# Altium schematic symbol library SignalCommunications.SCHLIB: 804 symbols (part 3 of 9) (continued)
## WE-RJ45-LAN-10/100/1000BT-SMD-7498111001 (continued)
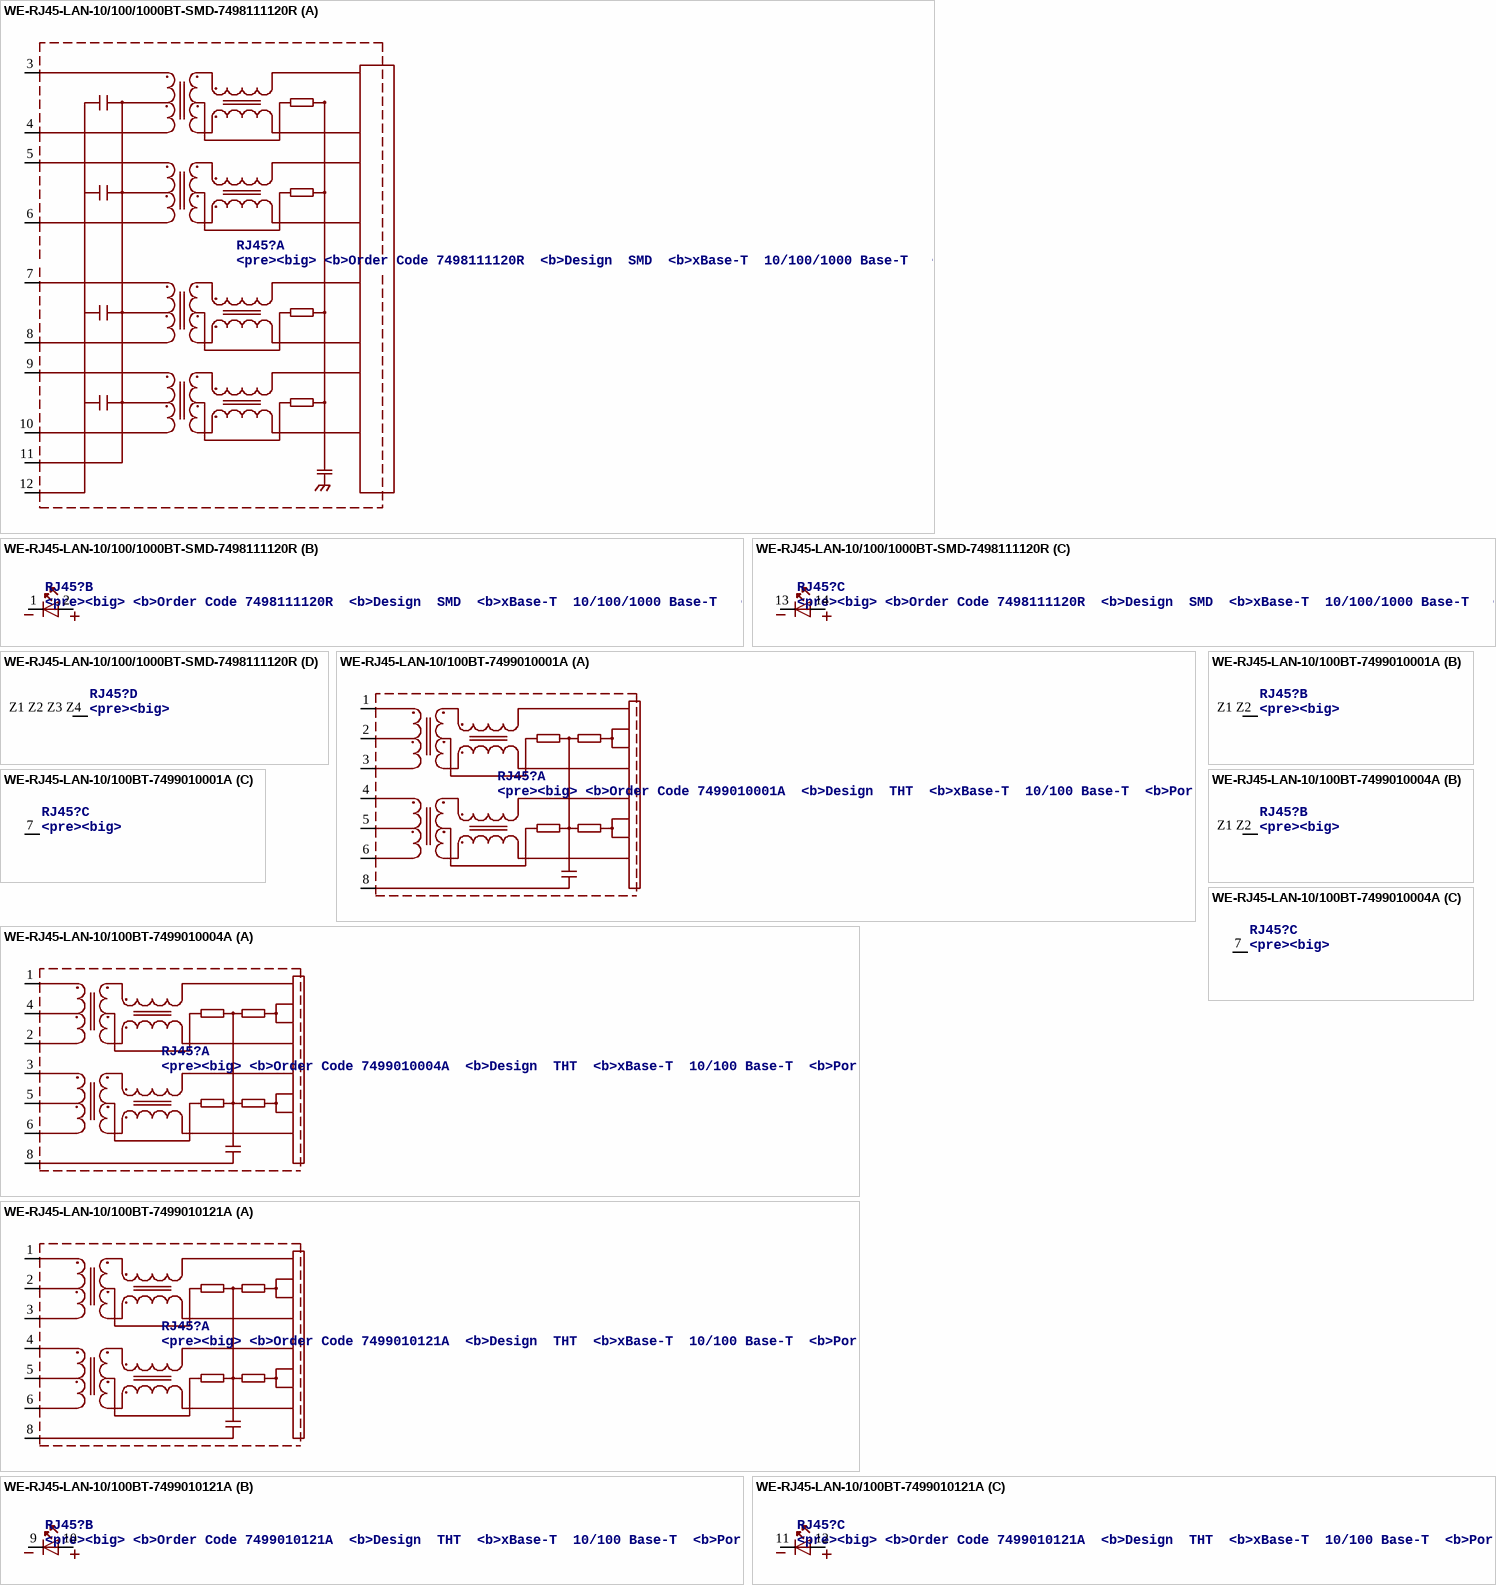
[diagram p19: symbols WE-RJ45-LAN-10/100/1000BT-SMD-7498111120R to WE-RJ45-LAN-10/100BT-7499010121A]

## WE-RJ45-LAN-10/100/1000BT-SMD-7498111120R
designator RJ45?, comment <pre><big> / <b>Order Code	7498111120R / <b>Design		SMD / <b>xBase-T		10/100/1000 Base-T / <b>Ports		1x1 / <b>Application	Standard / <b>Tab Position	UP / <b>LED (Left-Right)	YELLOW-GREEN / <b>EMI Fingers	Yes
MANUFACTURER: Würth Elektronik eiSos GmbH; CREATED-BY: Christin Zierenner; COMPANY-URL: http://www.we-online.de; CREATED-DATE: AUG 2012; DATASHEET-URL: http://katalog.we-online.de/kataloge/eisos/media/pdf/7498111120R.pdf
footprint 7498111120R
part A pins: 3 TRD0+, 4 TRD0-, 5 TRD1+, 6 TRD1-, 7 TRD2+, 8 TRD2-, 9 TRD3+, 10 TRD3-, 11 VCC (power), 12 GND (power)
part B pins: 1 K, 2 A
part C pins: 13 K, 14 A
part D pins: Z1 Z2 Z3 Z4 P$1 (power)

## WE-RJ45-LAN-10/100BT-7499010001A
designator RJ45?, comment <pre><big> / <b>Order Code	7499010001A / <b>Design		THT / <b>xBase-T		10/100 Base-T / <b>Ports		1x1 / <b>Application	Standard / <b>Tab Position	UP / <b>LED (Left-Right)	NONE / <b>EMI Fingers	No
MANUFACTURER: Würth Elektronik eiSos GmbH; CREATED-BY: Christin Zierenner; COMPANY-URL: http://www.we-online.de; CREATED-DATE: AUG 2012; DATASHEET-URL: http://katalog.we-online.de/kataloge/eisos/media/pdf/7499010001A.pdf
footprint 74990-WITHOUT-LED
part A pins: 1 RD+, 2 RCT, 3 RD-, 4 TD+, 5 TCT, 6 TD-, 8 SH (power)
part B pins: Z1 Z2 P$1 (power)
part C pins: 7 NC

## WE-RJ45-LAN-10/100BT-7499010004A
designator RJ45?, comment <pre><big> / <b>Order Code	7499010004A / <b>Design		THT / <b>xBase-T		10/100 Base-T / <b>Ports		1x1 / <b>Application	Standard / <b>Tab Position	Down / <b>LED (Left-Right)	NONE / <b>EMI Fingers	No
MANUFACTURER: Würth Elektronik eiSos GmbH; CREATED-BY: Christin Zierenner; COMPANY-URL: http://www.we-online.de; CREATED-DATE: AUG 2012; DATASHEET-URL: http://katalog.we-online.de/kataloge/eisos/media/pdf/7499010004A.pdf
footprint 7499010004A
part A pins: 1 RD+, 2 RD-, 3 TD+, 4 RCT, 5 TCT, 6 TD-, 8 SH (power)
part B pins: Z1 Z2 P$1 (power)
part C pins: 7 NC

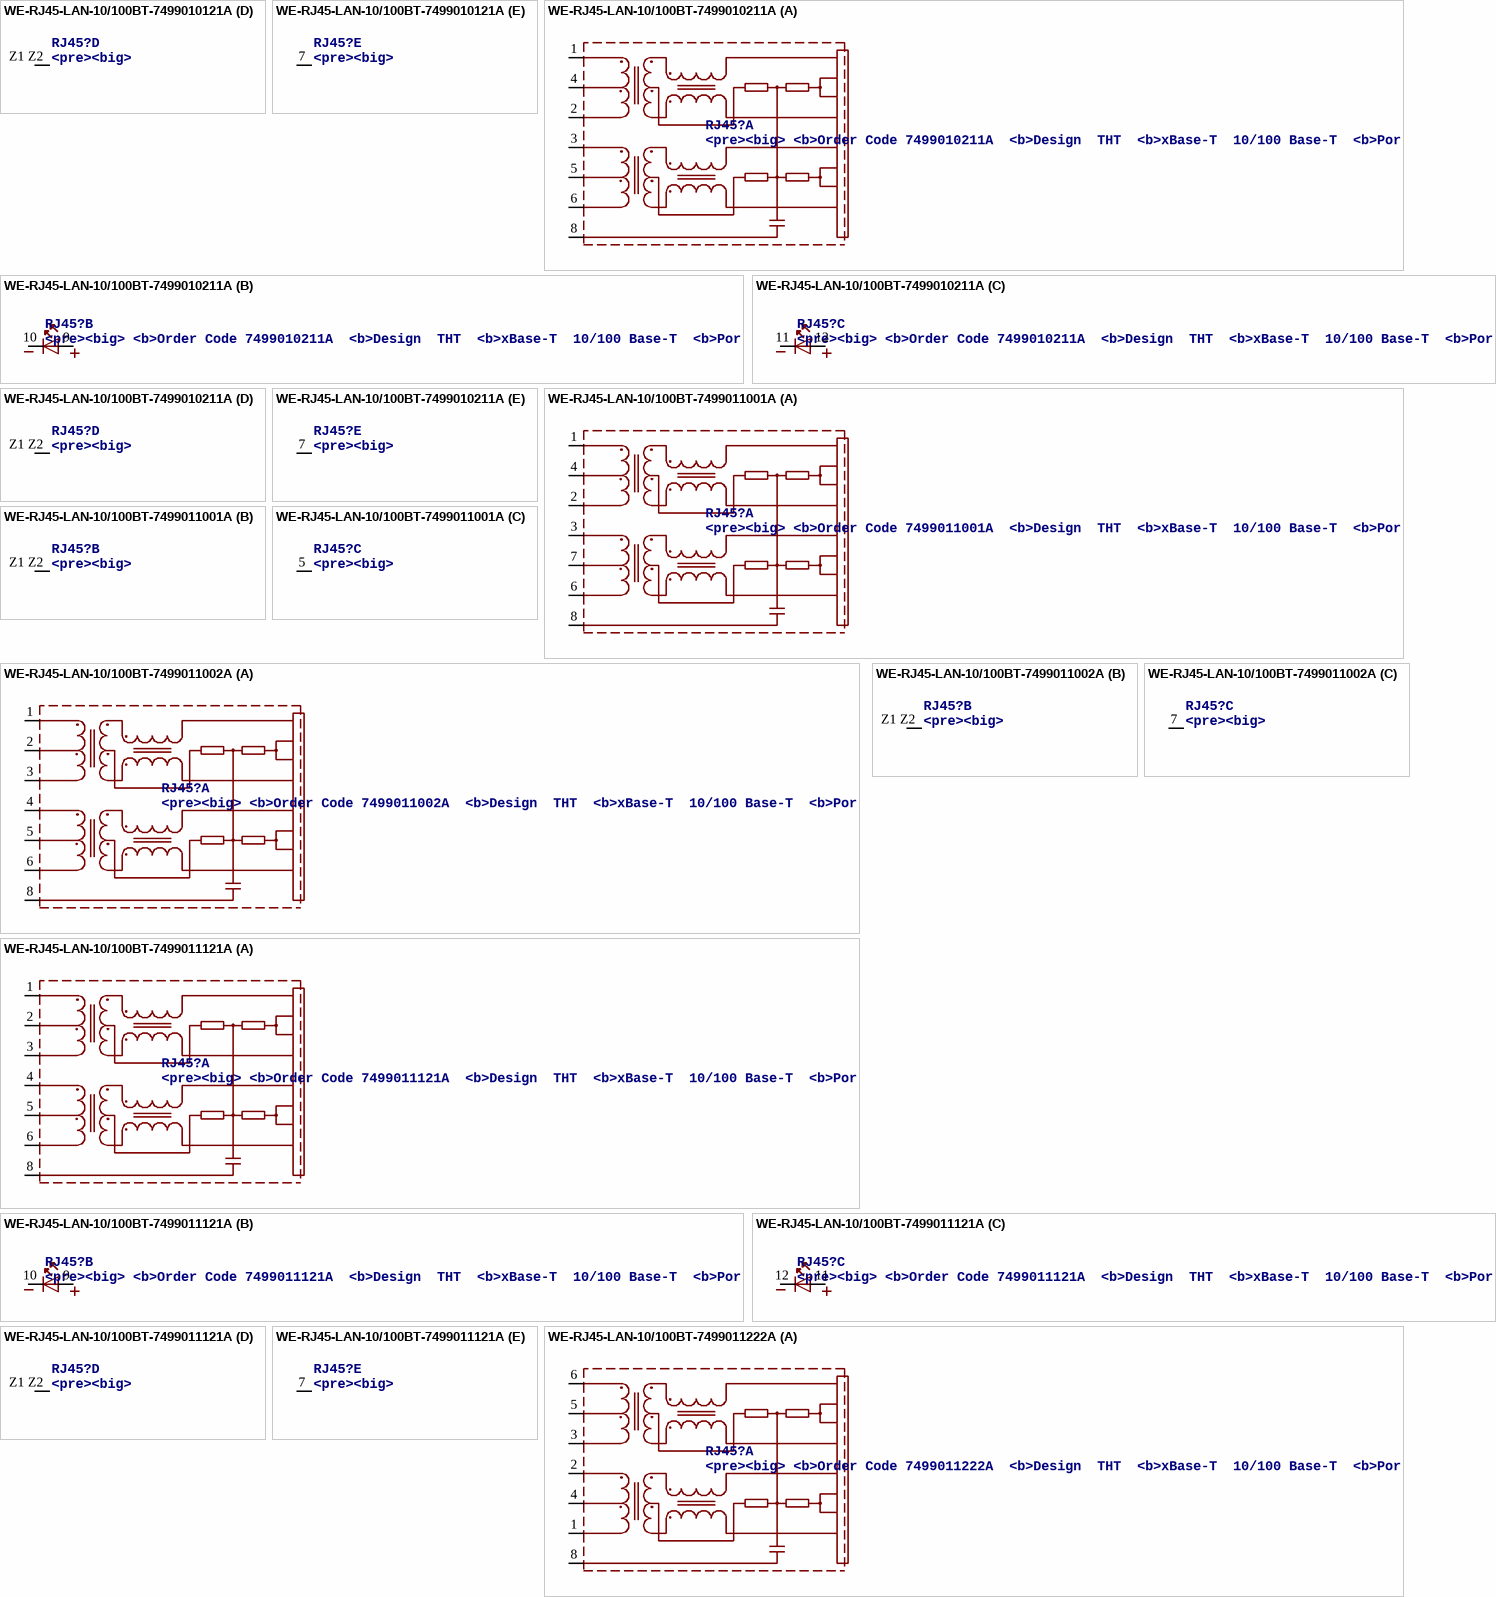
[diagram p20: symbols WE-RJ45-LAN-10/100BT-7499010121A to WE-RJ45-LAN-10/100BT-7499011222A]

## WE-RJ45-LAN-10/100BT-7499010121A
designator RJ45?, comment <pre><big> / <b>Order Code	7499010121A / <b>Design		THT / <b>xBase-T		10/100 Base-T / <b>Ports		1x1 / <b>Application	Standard / <b>Tab Position	UP / <b>LED (Left-Right)	Yellow-Green / <b>EMI Fingers	No
MANUFACTURER: Würth Elektronik eiSos GmbH; CREATED-BY: Christin Zierenner; COMPANY-URL: http://www.we-online.de; CREATED-DATE: AUG 2012; DATASHEET-URL: http://katalog.we-online.de/kataloge/eisos/media/pdf/7499010121A.pdf
footprint 74990-WITH-LED
part A pins: 1 TD+, 2 TCT, 3 TD-, 4 RD+, 5 RCT, 6 RD-, 8 SH (power)
part B pins: 9 K, 10 A
part C pins: 11 K, 12 A
part D pins: Z1 Z2 P$1 (power)
part E pins: 7 NC

## WE-RJ45-LAN-10/100BT-7499010211A
designator RJ45?, comment <pre><big> / <b>Order Code	7499010211A / <b>Design		THT / <b>xBase-T		10/100 Base-T / <b>Ports		1x1 / <b>Application	Standard / <b>Tab Position	DOWN / <b>LED (Left-Right)	Green-Yellow / <b>EMI Fingers	No
MANUFACTURER: Würth Elektronik eiSos GmbH; CREATED-BY: Christin Zierenner; COMPANY-URL: http://www.we-online.de; CREATED-DATE: AUG 2012; DATASHEET-URL: http://katalog.we-online.de/kataloge/eisos/media/pdf/7499010211A.pdf
footprint 74990-WITH-LED-TYPE2
part A pins: 1 TD+, 2 TD-, 3 RD+, 4 TCT, 5 RCT, 6 RD-, 8 SH (power)
part B pins: 9 A, 10 K
part C pins: 11 K, 12 A
part D pins: Z1 Z2 P$1 (power)
part E pins: 7 NC

## WE-RJ45-LAN-10/100BT-7499011001A
designator RJ45?, comment <pre><big> / <b>Order Code	7499011001A / <b>Design		THT / <b>xBase-T		10/100 Base-T / <b>Ports		1x1 / <b>Application	Standard / <b>Tab Position	Down / <b>LED (Left-Right)	NONE / <b>EMI Fingers	Yes
MANUFACTURER: Würth Elektronik eiSos GmbH; CREATED-BY: Christin Zierenner; COMPANY-URL: http://www.we-online.de; CREATED-DATE: AUG 2012; DATASHEET-URL: http://katalog.we-online.de/kataloge/eisos/media/pdf/7499011001A.pdf
footprint 74990-WITHOUT-LED-(21.84X15.88MM)
part A pins: 1 TD+, 2 TD-, 3 RD+, 4 TCT, 6 RD-, 7 RCT, 8 SH (power)
part B pins: Z1 Z2 P$1 (power)
part C pins: 5 NC

## WE-RJ45-LAN-10/100BT-7499011002A
designator RJ45?, comment <pre><big> / <b>Order Code	7499011002A / <b>Design		THT / <b>xBase-T		10/100 Base-T / <b>Ports		1x1 / <b>Application	Standard / <b>Tab Position	Down / <b>LED (Left-Right)	NONE / <b>EMI Fingers	Yes
MANUFACTURER: Würth Elektronik eiSos GmbH; CREATED-BY: Christin Zierenner; COMPANY-URL: http://www.we-online.de; CREATED-DATE: AUG 2012; DATASHEET-URL: http://katalog.we-online.de/kataloge/eisos/media/pdf/7499011002A.pdf
footprint 74990-WITHOUT-LED-(21.84X15.88MM)
part A pins: 1 TD+, 2 TCT, 3 TD-, 4 RD+, 5 RCT, 6 RD-, 8 SH (power)
part B pins: Z1 Z2 P$1 (power)
part C pins: 7 NC

## WE-RJ45-LAN-10/100BT-7499011121A
designator RJ45?, comment <pre><big> / <b>Order Code	7499011121A / <b>Design		THT / <b>xBase-T		10/100 Base-T / <b>Ports		1x1 / <b>Application	Standard / <b>Tab Position	DOWN / <b>LED (Left-Right)	Yellow-Green / <b>EMI Fingers	Yes
MANUFACTURER: Würth Elektronik eiSos GmbH; CREATED-BY: Christin Zierenner; COMPANY-URL: http://www.we-online.de; CREATED-DATE: AUG 2012; DATASHEET-URL: http://katalog.we-online.de/kataloge/eisos/media/pdf/7499011121A.pdf
footprint 74990-WITH-LED-TYPE1
part A pins: 1 TD+, 2 TCT, 3 TD-, 4 RD+, 5 RCT, 6 RD-, 8 SH (power)
part B pins: 9 A, 10 K
part C pins: 11 A, 12 K
part D pins: Z1 Z2 P$1 (power)
part E pins: 7 NC

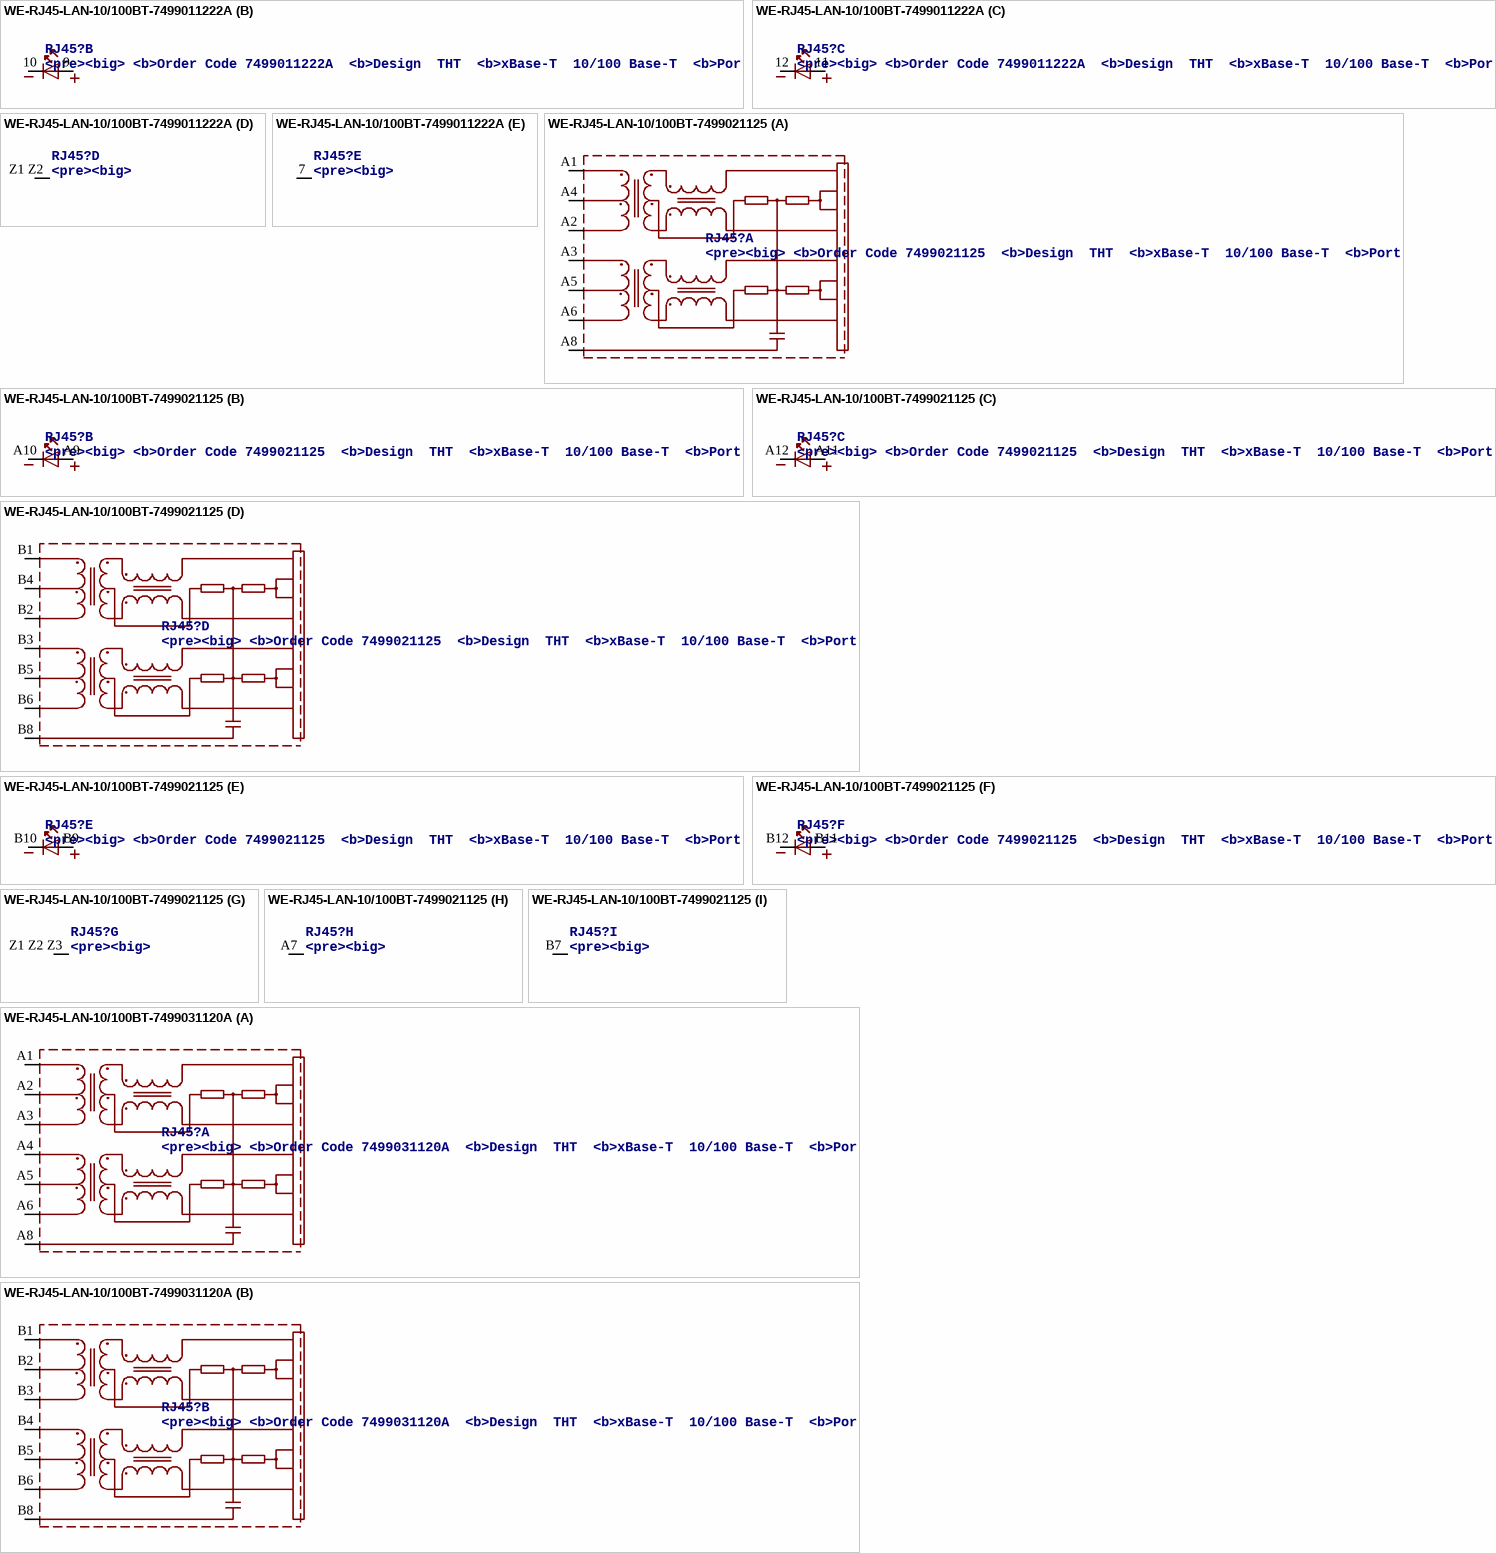
[diagram p21: symbols WE-RJ45-LAN-10/100BT-7499011222A to WE-RJ45-LAN-10/100BT-7499031120A]

## WE-RJ45-LAN-10/100BT-7499011222A
designator RJ45?, comment <pre><big> / <b>Order Code	7499011222A / <b>Design		THT / <b>xBase-T		10/100 Base-T / <b>Ports		1x1 / <b>Application	Standard / <b>Tab Position	DOWN / <b>LED (Left-Right)	Green-Green / <b>EMI Fingers	Yes
MANUFACTURER: Würth Elektronik eiSos GmbH; CREATED-BY: Christin Zierenner; COMPANY-URL: http://www.we-online.de; CREATED-DATE: AUG 2012; DATASHEET-URL: http://katalog.we-online.de/kataloge/eisos/media/pdf/7499011222A.pdf
footprint 74990-WITH-LED-TYPE1
part A pins: 1 TD-, 2 TD+, 3 RD-, 4 TCT, 5 RCT, 6 RD+, 8 SH (power)
part B pins: 9 A, 10 K
part C pins: 11 A, 12 K
part D pins: Z1 Z2 P$1 (power)
part E pins: 7 NC

## WE-RJ45-LAN-10/100BT-7499021125
designator RJ45?, comment <pre><big> / <b>Order Code	7499021125 / <b>Design		THT / <b>xBase-T		10/100 Base-T / <b>Ports		1x2 HORIZONTAL / <b>Application	Standard / <b>Tab Position	DOWN / <b>LED (Left-Right)	YELLOW-GREEN / <b>EMI Fingers	Yes
MANUFACTURER: Würth Elektronik eiSos GmbH; CREATED-BY: Christin Zierenner; COMPANY-URL: http://www.we-online.de; CREATED-DATE: AUG 2012; DATASHEET-URL: http://katalog.we-online.de/kataloge/eisos/media/pdf/7499021125.pdf
footprint 7499021125-2PORTS-HORIZONTAL
part A pins: A1 RD+, A2 RD-, A3 TD+, A4 RCT, A5 TCT, A6 TD-, A8 SH (power)
part B pins: A9 A, A10 K
part C pins: A11 A, A12 K
part D pins: B1 RD+, B2 RD-, B3 TD+, B4 RCT, B5 TCT, B6 TD-, B8 SH (power)
part E pins: B9 A, B10 K
part F pins: B11 A, B12 K
part G pins: Z1 Z2 Z3 P$1 (power)
part H pins: A7 NC
part I pins: B7 NC

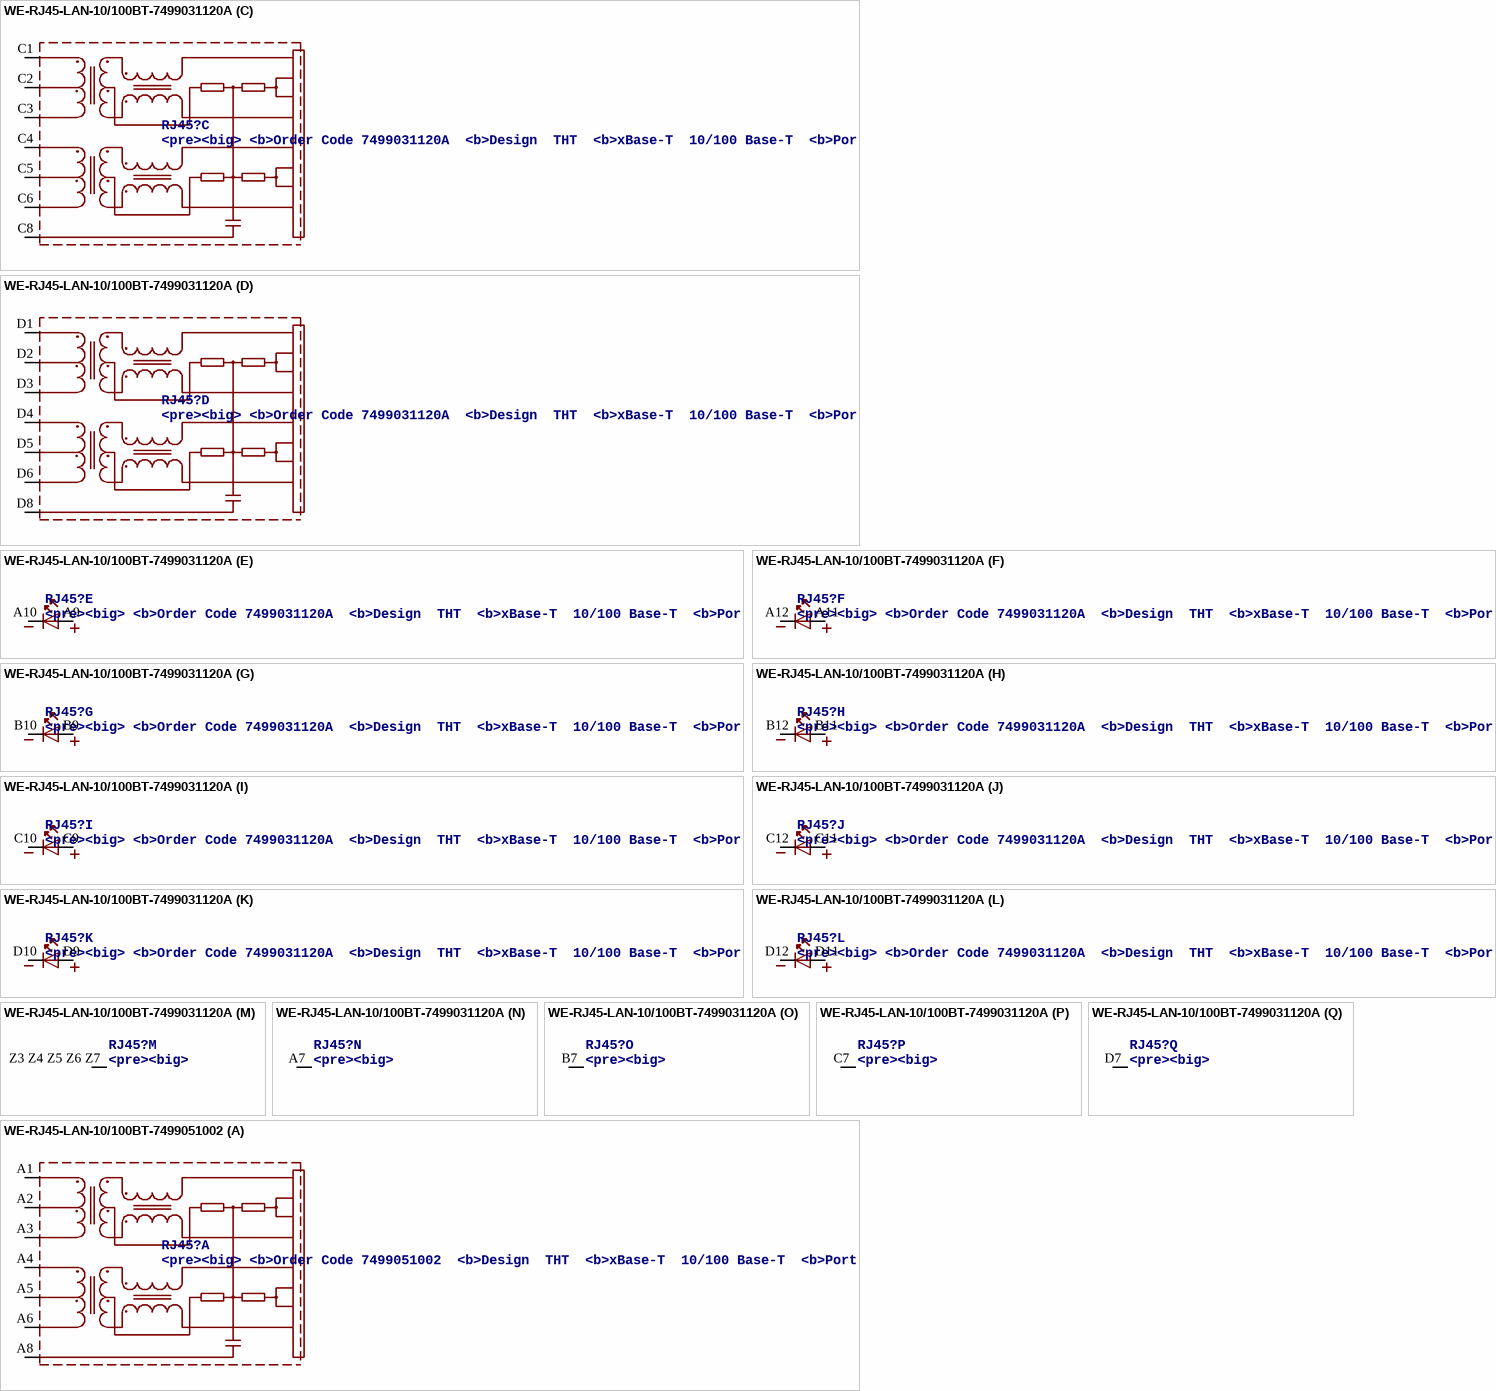
[diagram p22: symbols WE-RJ45-LAN-10/100BT-7499031120A to WE-RJ45-LAN-10/100BT-7499051002]

## WE-RJ45-LAN-10/100BT-7499031120A
designator RJ45?, comment <pre><big> / <b>Order Code	7499031120A / <b>Design		THT / <b>xBase-T		10/100 Base-T / <b>Ports		1x4 HORIZONTAL / <b>Application	Standard / <b>Tab Position	DOWN / <b>LED (Left-Right)	YELLOW-GREEN / <b>EMI Fingers	Yes
MANUFACTURER: Würth Elektronik eiSos GmbH; CREATED-BY: Christin Zierenner; COMPANY-URL: http://www.we-online.de; CREATED-DATE: AUG 2012; DATASHEET-URL: http://katalog.we-online.de/kataloge/eisos/media/pdf/7499031120A.pdf
footprint 7499031120A-4PORTS-HORIZONTAL
part A pins: A1 RD+, A2 RCT, A3 RD-, A4 TD+, A5 TCT, A6 TD-, A8 SH (power)
part B pins: B1 RD+, B2 RCT, B3 RD-, B4 TD+, B5 TCT, B6 TD-, B8 SH (power)
part C pins: C1 RD+, C2 RCT, C3 RD-, C4 TD+, C5 TCT, C6 TD-, C8 SH (power)
part D pins: D1 RD+, D2 RCT, D3 RD-, D4 TD+, D5 TCT, D6 TD-, D8 SH (power)
part E pins: A9 A, A10 K
part F pins: A11 A, A12 K
part G pins: B9 A, B10 K
part H pins: B11 A, B12 K
part I pins: C9 A, C10 K
part J pins: C11 A, C12 K
part K pins: D9 A, D10 K
part L pins: D11 A, D12 K
part M pins: Z3 Z4 Z5 Z6 Z7 P$1 (power)
part N pins: A7 NC
part O pins: B7 NC
part P pins: C7 NC
part Q pins: D7 NC

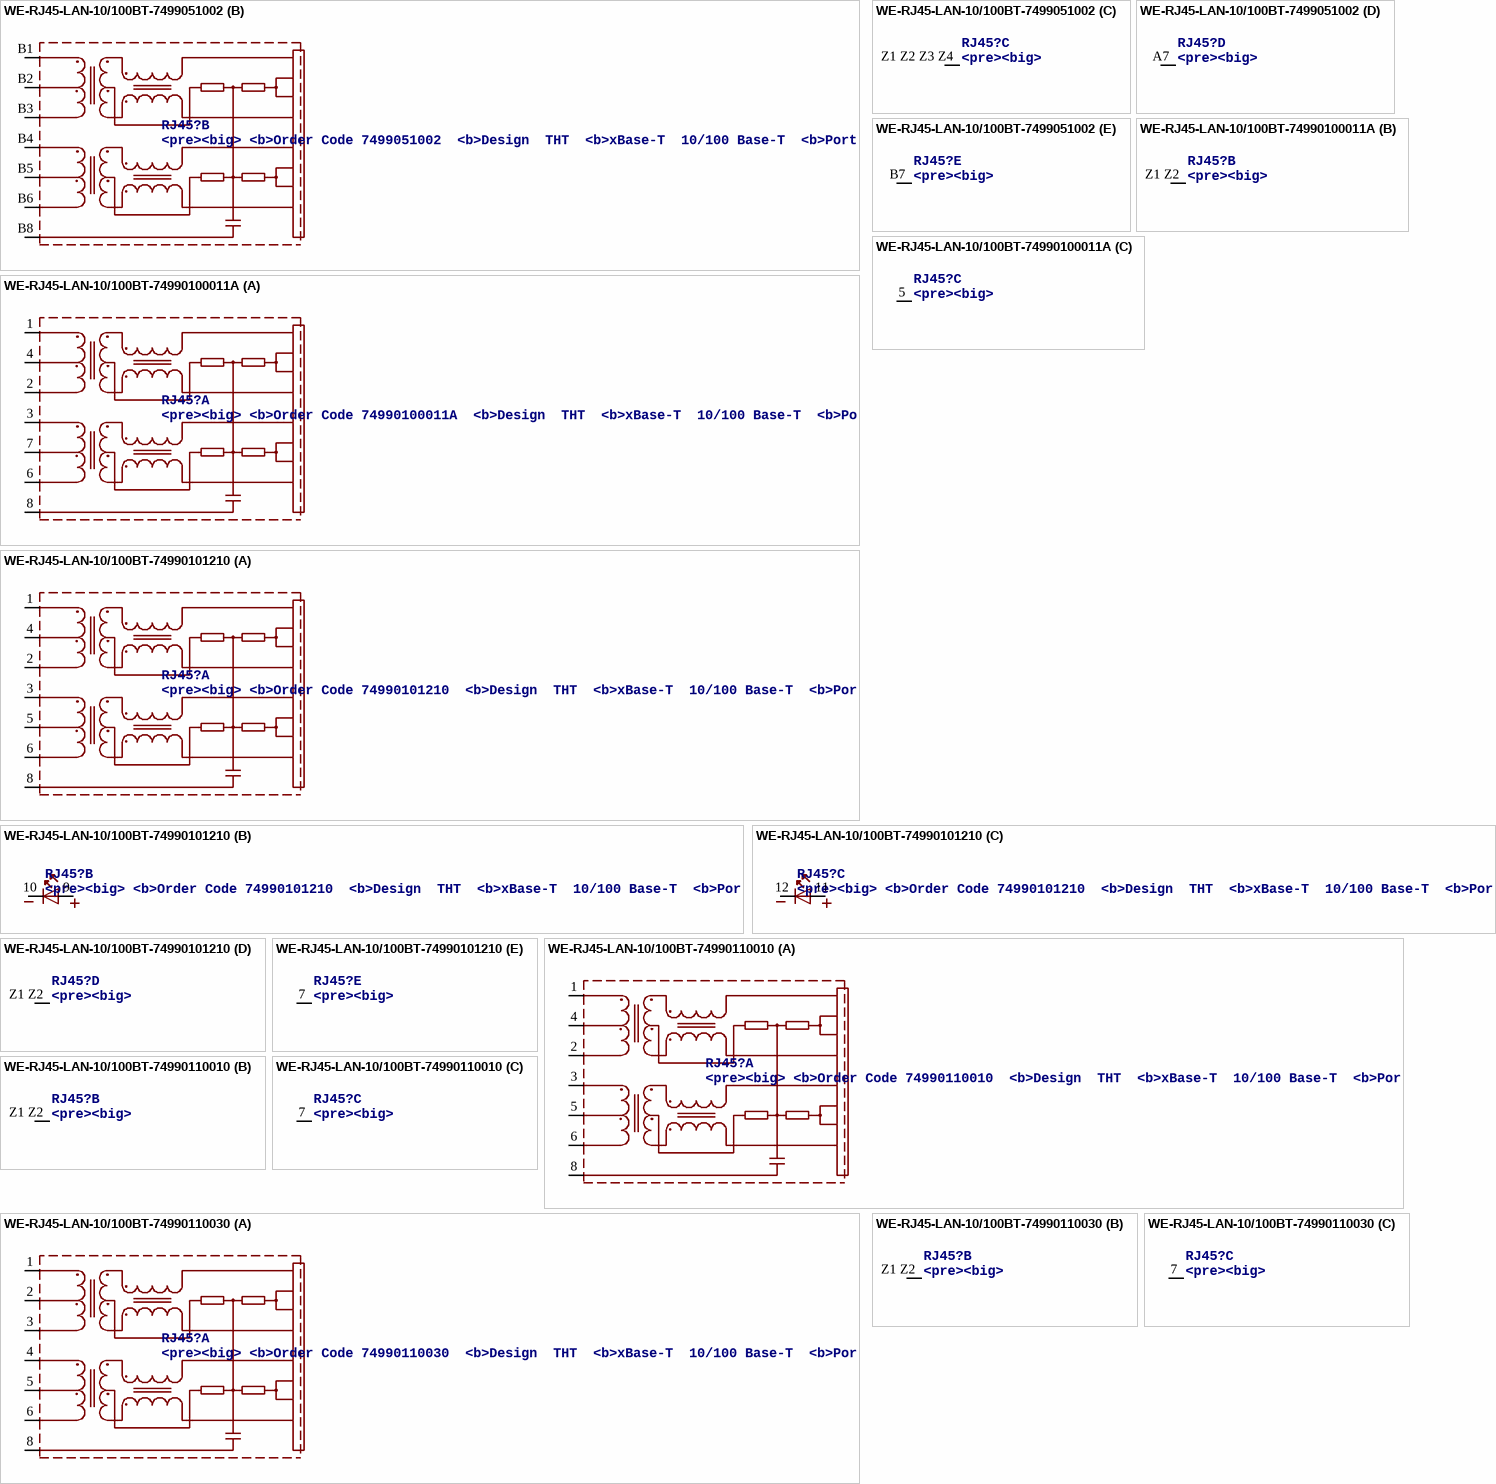
[diagram p23: symbols WE-RJ45-LAN-10/100BT-7499051002 to WE-RJ45-LAN-10/100BT-74990110030]

## WE-RJ45-LAN-10/100BT-7499051002
designator RJ45?, comment <pre><big> / <b>Order Code	7499051002 / <b>Design		THT / <b>xBase-T		10/100 Base-T / <b>Ports		1x2 STACKED / <b>Application	Standard / <b>Tab Position	UP & DOWN / <b>LED (Left-Right)	NONE / <b>EMI Fingers	Yes
MANUFACTURER: Würth Elektronik eiSos GmbH; CREATED-BY: Christin Zierenner; COMPANY-URL: http://www.we-online.de; CREATED-DATE: AUG 2012; DATASHEET-URL: http://katalog.we-online.de/kataloge/eisos/media/pdf/7499051002.pdf
footprint 7499051002-1X2-STACKED
part A pins: A1 TD+, A2 TCT, A3 TD-, A4 RD+, A5 RCT, A6 RD-, A8 SH (power)
part B pins: B1 TD+, B2 TCT, B3 TD-, B4 RD+, B5 RCT, B6 RD-, B8 SH (power)
part C pins: Z1 Z2 Z3 Z4 P$1 (power)
part D pins: A7 NC
part E pins: B7 NC

## WE-RJ45-LAN-10/100BT-74990100011A
designator RJ45?, comment <pre><big> / <b>Order Code	74990100011A / <b>Design		THT / <b>xBase-T		10/100 Base-T / <b>Ports		1x1 / <b>Application	Standard / <b>Tab Position	UP / <b>LED (Left-Right)	NONE / <b>EMI Fingers	No
MANUFACTURER: Würth Elektronik eiSos GmbH; CREATED-BY: Christin Zierenner; COMPANY-URL: http://www.we-online.de; CREATED-DATE: AUG 2012; DATASHEET-URL: http://katalog.we-online.de/kataloge/eisos/media/pdf/74990100011A.pdf
footprint 74990-WITHOUT-LED-(21.84X16.2MM)
part A pins: 1 RD+, 2 RD-, 3 TD+, 4 RCT, 6 TD-, 7 TCT, 8 SH (power)
part B pins: Z1 Z2 P$1 (power)
part C pins: 5 NC

## WE-RJ45-LAN-10/100BT-74990101210
designator RJ45?, comment <pre><big> / <b>Order Code	74990101210 / <b>Design		THT / <b>xBase-T		10/100 Base-T / <b>Ports		1x1 Vertical / <b>Application	Standard / <b>Tab Position 	Vertical / <b>LED (Left-Right)	Yellow-Green / <b>EMI Fingers	No
MANUFACTURER: Würth Elektronik eiSos GmbH; CREATED-BY: Christin Zierenner; COMPANY-URL: http://www.we-online.de; CREATED-DATE: AUG 2012; DATASHEET-URL: http://katalog.we-online.de/kataloge/eisos/media/pdf/74990101210.pdf
footprint 74990101210-VERTICALMOUNT
part A pins: 1 TD+, 2 TD-, 3 RD+, 4 TCT, 5 RCT, 6 RD-, 8 SH (power)
part B pins: 9 A, 10 K
part C pins: 11 A, 12 K
part D pins: Z1 Z2 P$1 (power)
part E pins: 7 NC

## WE-RJ45-LAN-10/100BT-74990110010
designator RJ45?, comment <pre><big> / <b>Order Code	74990110010 / <b>Design		THT / <b>xBase-T		10/100 Base-T / <b>Ports		1x1 / <b>Application	Standard / <b>Tab Position	UP / <b>LED (Left-Right)	NONE / <b>EMI Fingers	Yes
MANUFACTURER: Würth Elektronik eiSos GmbH; CREATED-BY: Christin Zierenner; COMPANY-URL: http://www.we-online.de; CREATED-DATE: AUG 2012; DATASHEET-URL: http://katalog.we-online.de/kataloge/eisos/media/pdf/74990110010.pdf
footprint 74990-WITHOUT-LED
part A pins: 1 TD+, 2 TD-, 3 RD+, 4 TCT, 5 RCT, 6 RD-, 8 SH (power)
part B pins: Z1 Z2 P$1 (power)
part C pins: 7 NC

## WE-RJ45-LAN-10/100BT-74990110030
designator RJ45?, comment <pre><big> / <b>Order Code	74990110030 / <b>Design		THT / <b>xBase-T		10/100 Base-T / <b>Ports		1x1 / <b>Application	Standard / <b>Tab Position	UP / <b>LED (Left-Right)	NONE / <b>EMI Fingers	Yes
MANUFACTURER: Würth Elektronik eiSos GmbH; CREATED-BY: Christin Zierenner; COMPANY-URL: http://www.we-online.de; CREATED-DATE: AUG 2012; DATASHEET-URL: http://katalog.we-online.de/kataloge/eisos/media/pdf/74990110030.pdf
footprint 74990110030
part A pins: 1 TD+, 2 TCT, 3 TD-, 4 RD+, 5 RCT, 6 RD-, 8 SH (power)
part B pins: Z1 Z2 P$1 (power)
part C pins: 7 NC

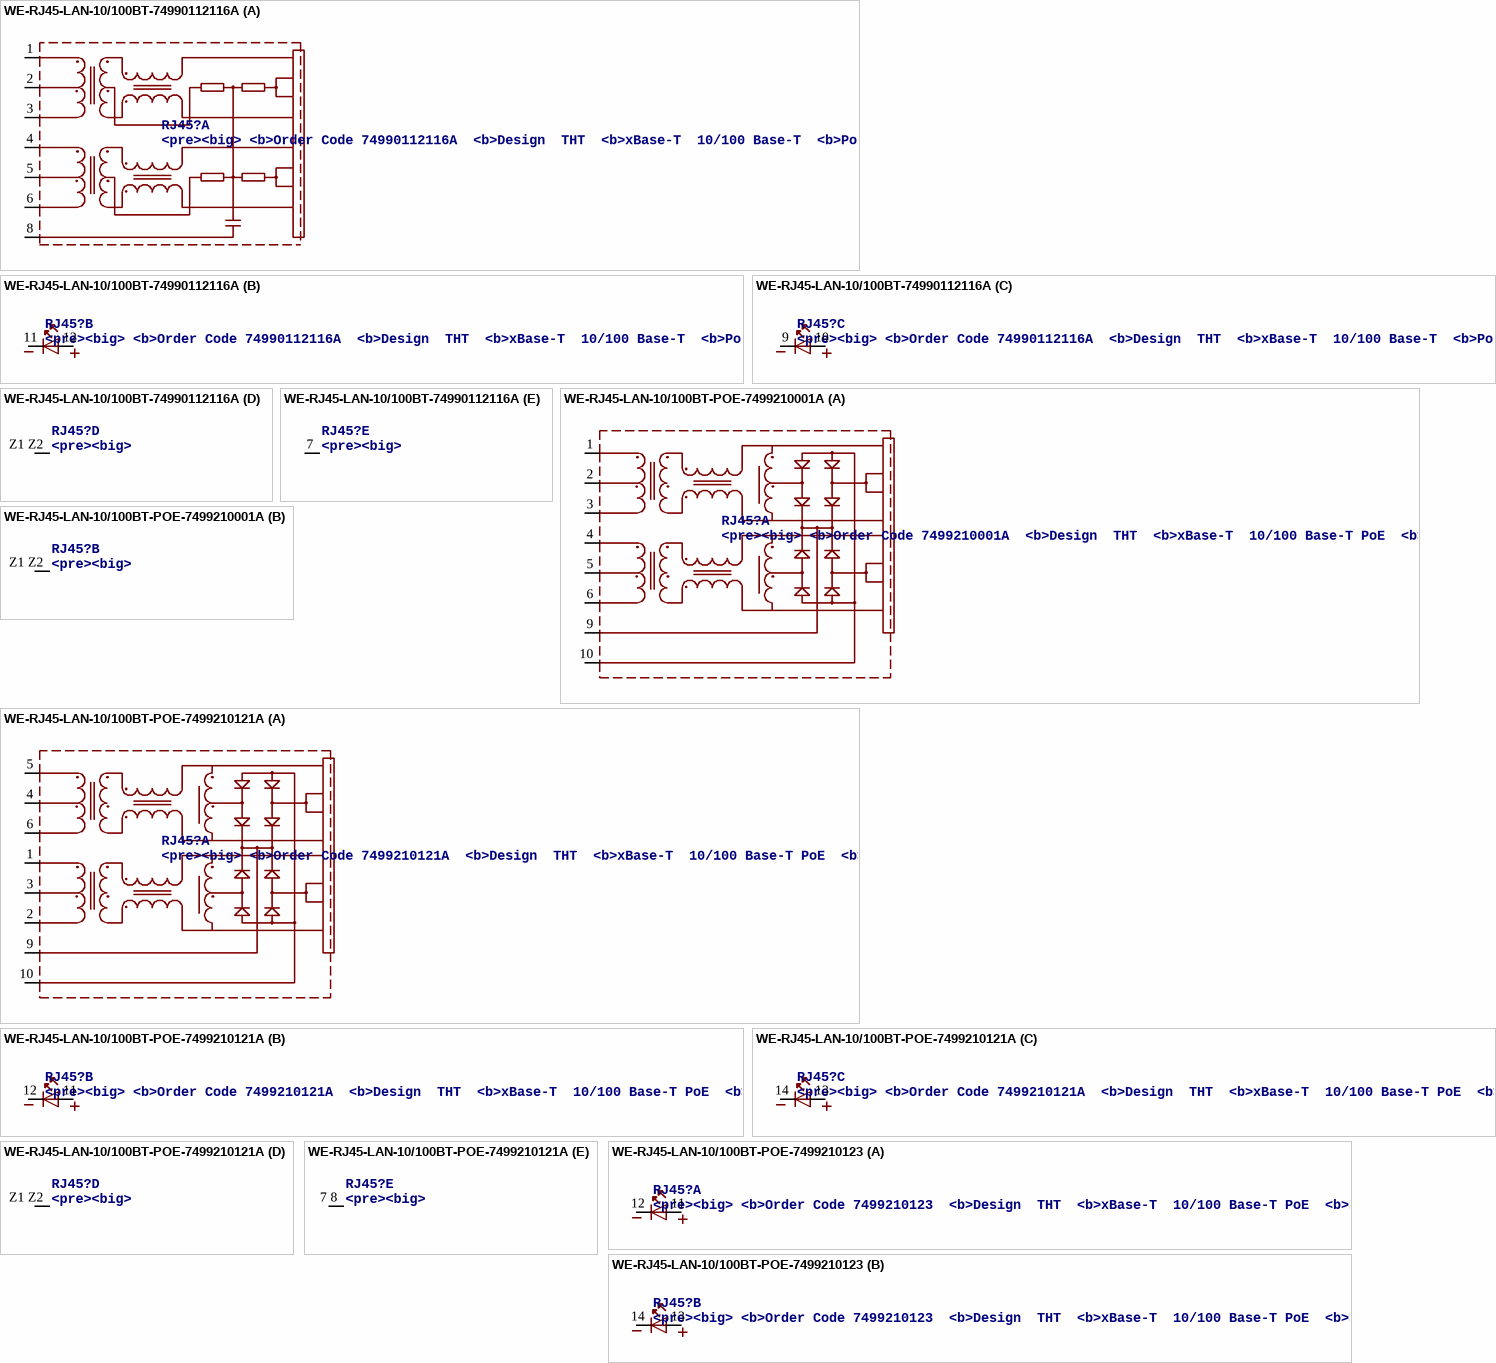
[diagram p24: symbols WE-RJ45-LAN-10/100BT-74990112116A to WE-RJ45-LAN-10/100BT-POE-7499210123]

## WE-RJ45-LAN-10/100BT-74990112116A
designator RJ45?, comment <pre><big> / <b>Order Code	74990112116A / <b>Design		THT / <b>xBase-T		10/100 Base-T / <b>Ports		1x1 / <b>Application	Standard / <b>Tab Position	UP / <b>LED (Left-Right)	Green-Yellow / <b>EMI Fingers	Yes
MANUFACTURER: Würth Elektronik eiSos GmbH; CREATED-BY: Christin Zierenner; COMPANY-URL: http://www.we-online.de; CREATED-DATE: AUG 2012; DATASHEET-URL: http://katalog.we-online.de/kataloge/eisos/media/pdf/74990112116A.pdf
footprint 74990-WITH-LED
part A pins: 1 TD+, 2 TCT, 3 TD-, 4 RD+, 5 RCT, 6 RD-, 8 SH (power)
part B pins: 11 K, 12 A
part C pins: 9 K, 10 A
part D pins: Z1 Z2 P$1 (power)
part E pins: 7 NC

## WE-RJ45-LAN-10/100BT-POE-7499210001A
designator RJ45?, comment <pre><big> / <b>Order Code	7499210001A / <b>Design		THT / <b>xBase-T		10/100 Base-T PoE / <b>Ports		1x1 / <b>Application	PoE / <b>Tab Position	UP / <b>LED (Left-Right)	NONE / <b>EMI Fingers	No
MANUFACTURER: Würth Elektronik eiSos GmbH; CREATED-BY: Christin Zierenner; COMPANY-URL: http://www.we-online.de; CREATED-DATE: AUG 2012; DATASHEET-URL: http://katalog.we-online.de/kataloge/eisos/media/pdf/7499210001A.pdf
footprint 7499210001A
part A pins: 1 RD+, 2 RCT, 3 RD-, 4 TD+, 5 TCT, 6 TD-, 9 VC1+ (power), 10 VC1- (power)
part B pins: Z1 Z2 P$1 (power)

## WE-RJ45-LAN-10/100BT-POE-7499210121A
designator RJ45?, comment <pre><big> / <b>Order Code	7499210121A / <b>Design		THT / <b>xBase-T		10/100 Base-T PoE / <b>Ports		1x1 / <b>Application	PoE / <b>Tab Position	DOWN / <b>LED (Left-Right)	YELLOW-GREEN / <b>EMI Fingers	No
MANUFACTURER: Würth Elektronik eiSos GmbH; CREATED-BY: Christin Zierenner; COMPANY-URL: http://www.we-online.de; CREATED-DATE: AUG 2012; DATASHEET-URL: http://katalog.we-online.de/kataloge/eisos/media/pdf/7499210121A.pdf
footprint 7499210121A
part A pins: 1 TD+, 2 TD-, 3 TCT, 4 RCT, 5 RD+, 6 RD-, 9 VC1+ (power), 10 VC1- (power)
part B pins: 11 A, 12 K
part C pins: 13 A, 14 K
part D pins: Z1 Z2 P$1 (power)
part E pins: 7 8 NC

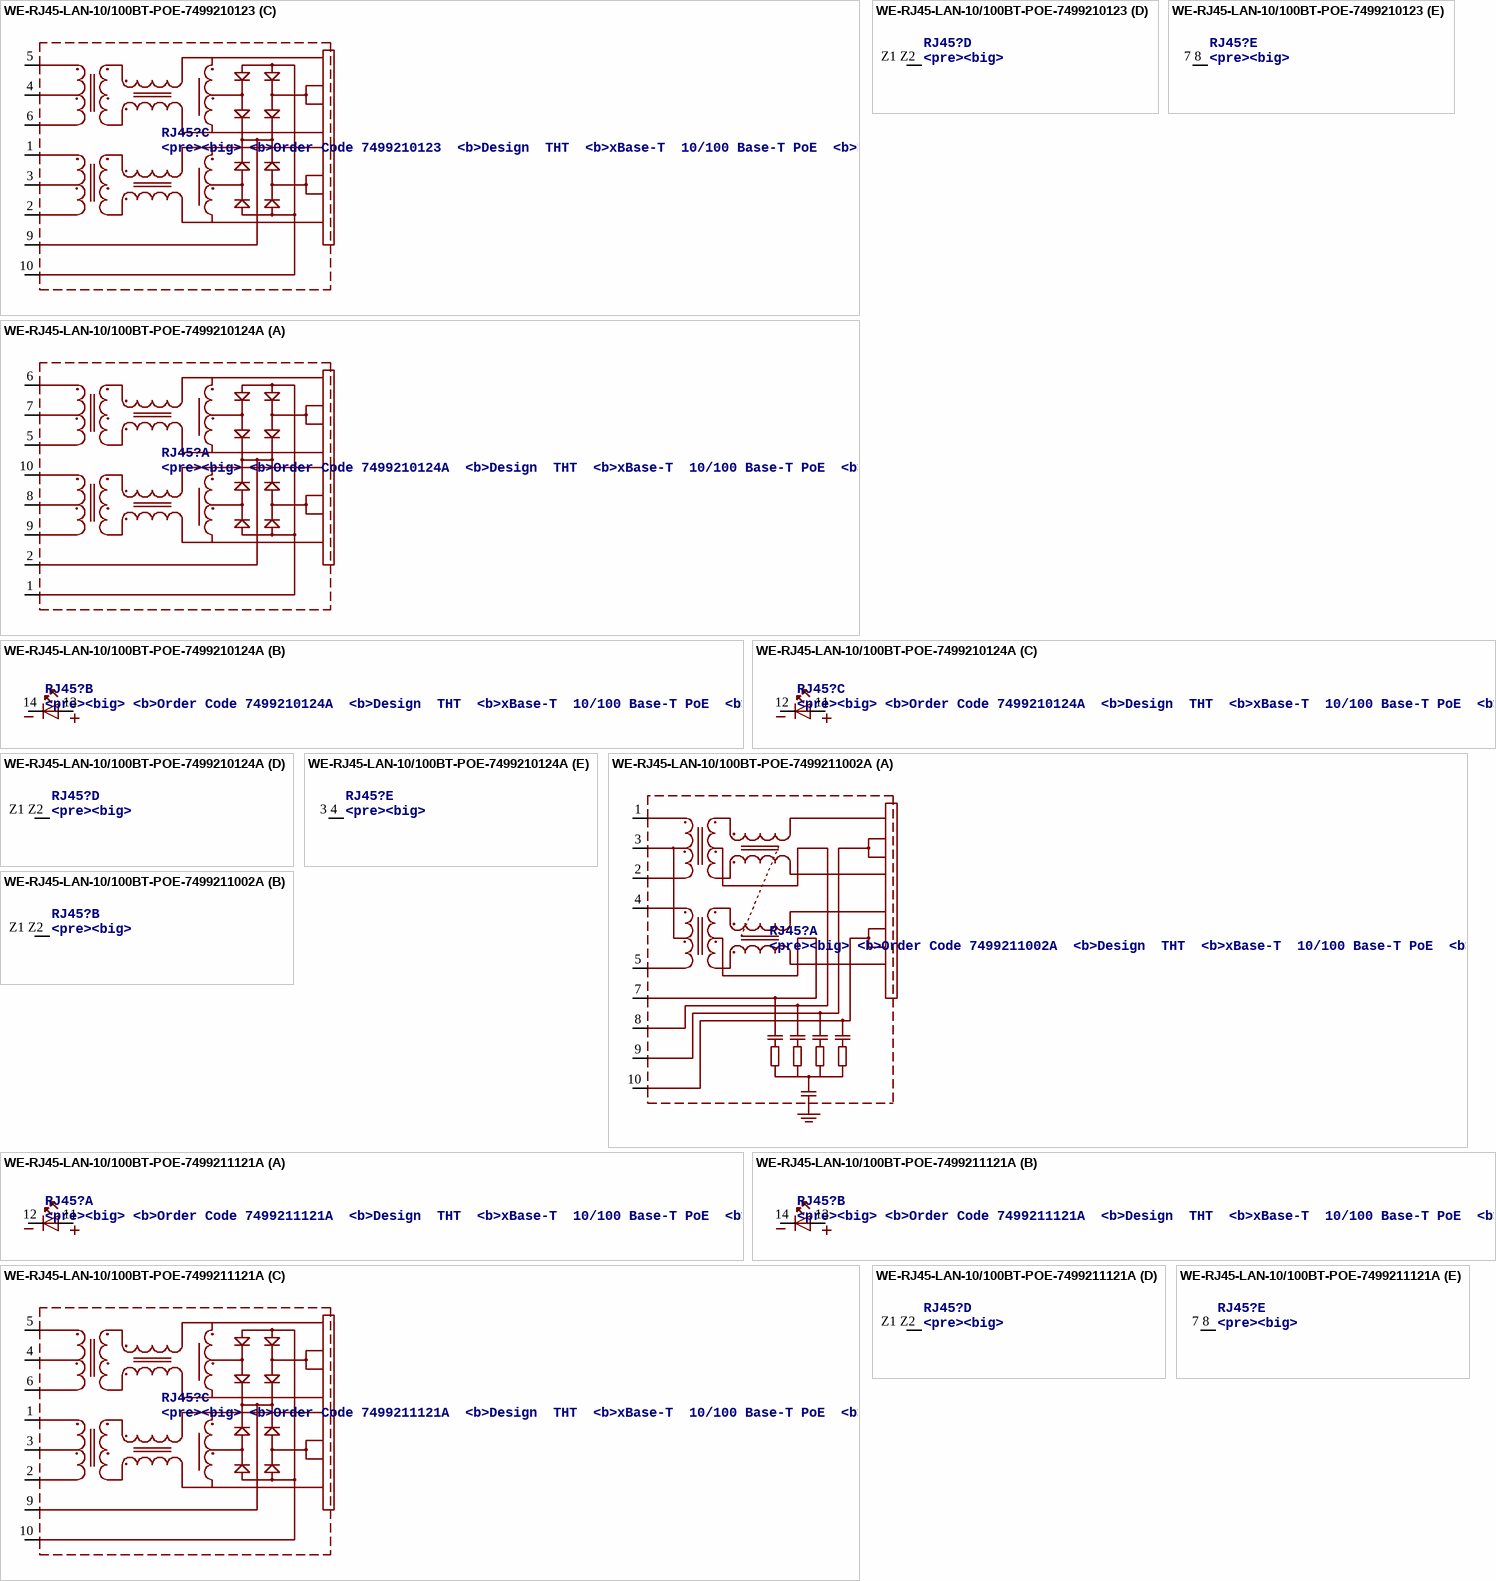
[diagram p25: symbols WE-RJ45-LAN-10/100BT-POE-7499210123 to WE-RJ45-LAN-10/100BT-POE-7499211121A]

## WE-RJ45-LAN-10/100BT-POE-7499210123
designator RJ45?, comment <pre><big> / <b>Order Code	7499210123 / <b>Design		THT / <b>xBase-T		10/100 Base-T PoE / <b>Ports		1x1 / <b>Application	PoE / <b>Tab Position	VERTICAL / <b>LED (Left-Right)	YELLOW-GREEN / <b>EMI Fingers	No
MANUFACTURER: Würth Elektronik eiSos GmbH; CREATED-BY: Christin Zierenner; COMPANY-URL: http://www.we-online.de; CREATED-DATE: AUG 2012; DATASHEET-URL: http://katalog.we-online.de/kataloge/eisos/media/pdf/7499210123.pdf
footprint 7499210123
part A pins: 11 A, 12 K
part B pins: 13 A, 14 K
part C pins: 1 TD+, 2 TD-, 3 TCT, 4 RCT, 5 RD+, 6 RD-, 9 VC1+ (power), 10 VC1- (power)
part D pins: Z1 Z2 P$1 (power)
part E pins: 7 8 NC